# Altium footprint library GyokuRe.PcbLib: 1248 footprints (part 72 of 78)
Each footprint in its own frame and in the unit in brackets; x right, y up, seen from the top. Pads: shape width x height; smd on the part's side, far side on the other; paste and mask are expansions set on the pad; w line width, h text height; cw(c..) or ccw(c..) is an arc to the next point about the centre after c.
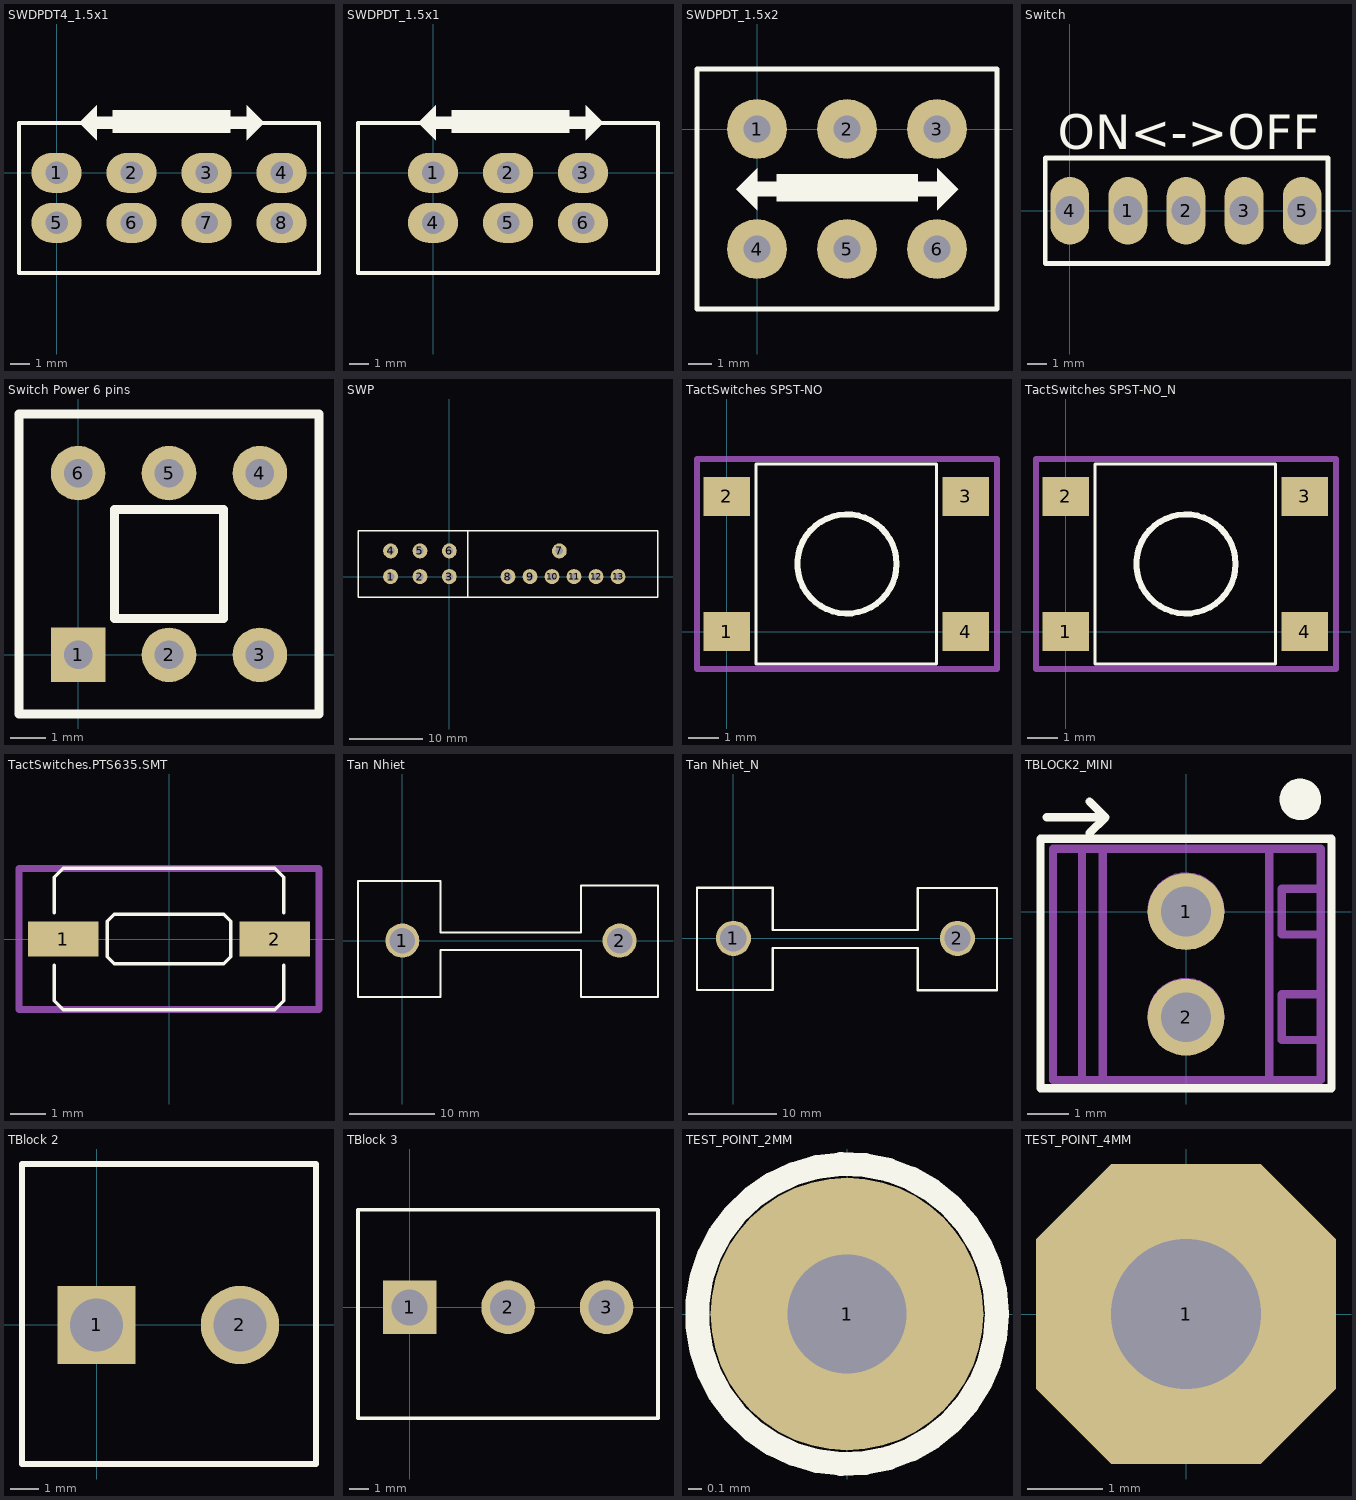
[diagram p71: the footprints below, top view; thin cyan lines are the x and y axes]

## SWDPDT4_1.5x1 [mil] "Switch 3 DPDT, Pin to Pin 150mil, Row to Row 100mil"
pads (8):
  oval 100x80 hole 45: 1(0,0) 2(150,0) 3(300,0) 4(450,0) 5(0,-100) 6(150,-100) 7(300,-100) 8(450,-100)
Top Overlay:
  region: 80,135 80,65 45,100
  region: 380,135 380,65 415,100
  region: 112.5,125 347.5,125 347.5,80 112.5,80
  lines w8: -75,-200 525,-200 525,100 -75,100 -75,-200
  lines w25: 75,100 125,100 ; 335,100 385,100

## SWDPDT_1.5x1 [mil] "Switch DPDT, Pin to Pin 150mil, Row to Row 100mil"
pads (6):
  oval 100x80 hole 45: 1(0,0) 2(150,0) 3(300,0) 4(0,-100) 5(150,-100) 6(300,-100)
Top Overlay:
  region: 5,135 5,65 -30,100
  region: 305,135 305,65 340,100
  region: 37.5,125 272.5,125 272.5,80 37.5,80
  lines w8: -150,-200 450,-200 450,100 -150,100 -150,-200
  lines w25: 0,100 50,100 ; 260,100 310,100

## SWDPDT_1.5x2 [mil] "Switch DPDT, Pin to Pin 150mil, Row to Row 200mil"
pads (6):
  round 100 hole 45: 1(0,0) 2(150,0) 3(300,0) 4(0,-200) 5(150,-200) 6(300,-200)
Top Overlay:
  region: 0,-65 0,-135 -35,-100
  region: 300,-65 300,-135 335,-100
  region: 32.5,-75 267.5,-75 267.5,-120 32.5,-120
  lines w8: -100,-300 400,-300 400,100 -100,100 -100,-300
  lines w25: -5,-100 45,-100 ; 255,-100 305,-100

## Switch [mm]
pads (5):
  oval 2x3.5 hole 1.5: 1(3,0) 2(6,0) 3(9,0) 4(0,0) 5(12,0)
Top Overlay:
  lines w0.254: -1.27,-2.73 13.335,-2.73 13.335,2.73 -1.27,2.73 -1.27,-2.73
  text "ON<->OFF" at -0.635,3.175 h1.8
3D body "User Library-Assem1-20.STEP": height 2.6, standoff -6, extent -0.5,-2.85 12.5,9.35

## Switch Power 6 pins [mil] "Switch Power 6 pins"
pads (6):
  rect 60x60 hole 31.5: 1(0,0)
  round 60 hole 31.5: 2(100,0) 3(200,0) 4(200,200) 5(100,200) 6(0,200)
Top Overlay:
  lines w10: -65,-65 265,-65 265,265 -65,265 -65,-65 ; 40,40 40,160 160,160 160,40 40,40
3D body: height 196.85, standoff 118.11, extent -56.39,-57.09 256.89,255.62
3D body: height 275.59, standoff 236.22, extent 60.04,59.06 140.75,139.76
3D body: height 236.22, standoff 196.85, extent 40.35,40.35 159.45,160.43
3D body: height 118.11, standoff 3.94, extent -60.04,-60.04 259.84,260.83

## SWP [mil] "SW Power"
height 100
pads (13):
  round 80 hole 40: 1(-314.96,0) 2(-157.48,0) 3(0,0) 4(-314.96,137.8) 5(-157.48,137.8) 6(0,137.8) 7(590.55,137.8) 8(314.96,0) 9(433.07,0) 10(551.18,0) 11(669.29,0) 12(787.4,0) 13(905.51,0)
Top Overlay:
  lines w8: 100,-109.33 100,245 ; -490,-110 1120,-110 1120,245 -490,245 -490,-110

## TactSwitches SPST-NO [mm] "SWITCH TACT 6MM 230GF H=4.3MM"
pads (4):
  rect 1.55x1.3 smd: 1(0,0) 2(0,4.5) 3(7.95,4.5) 4(7.95,0)
Top Overlay:
  circle w0.2: c4,2.25 r1.65
  lines w0.1: 0.975,-1.075 0.975,5.575 6.975,5.575 6.975,-1.075 0.975,-1.075
Mechanical 13:
  lines w0.2: -0.991,-1.245 -0.991,5.74 8.992,5.74 8.992,-1.245 -0.991,-1.245
3D body: height 3.65, standoff 2, extent 0.75,-1.25 7.25,5.75
3D body: height 2, standoff 0.1, extent 1,-1 7,5.5
3D body: height 4.3, standoff 3, extent 2.25,0.5 5.75,4
3D body: height 0.15, standoff 0.01, extent -0.5,4.15 1.1,4.85
3D body: height 0.15, standoff 0.01, extent -0.5,-0.35 1.1,0.35
3D body: height 0.15, standoff 0.01, extent 6.9,4.15 8.5,4.85
3D body: height 0.15, standoff 0.01, extent 6.9,-0.35 8.5,0.35

## TactSwitches SPST-NO_N [mm] "SWITCH TACT 6MM 230GF H=4.3MM"
pads (4):
  rect 1.55x1.3 smd: 1(0,0) 2(0,4.5) 3(7.95,4.5) 4(7.95,0)
Top Overlay:
  circle w0.2: c4,2.25 r1.65
  lines w0.1: 0.975,-1.075 0.975,5.575 6.975,5.575 6.975,-1.075 0.975,-1.075
Mechanical 13:
  lines w0.2: -0.991,-1.245 -0.991,5.74 8.992,5.74 8.992,-1.245 -0.991,-1.245
3D body "TACT Switch - SKHUAME010.STEP": height 2.5, standoff 0, extent 0.432,-0.989 7.632,5.511

## TactSwitches.PTS635.SMT [mil] "3,5 mm Tact Switches, PTS635 Series"
pads (2):
  rect 79x39 smd: 1(-118,0) 2(118,0)
Top Overlay:
  lines w3.94: -127.95,-29.53 -127.95,-68.9 -118.11,-78.74 118.11,-78.74 127.95,-68.9 127.95,-29.53 ; -127.95,29.53 -127.95,68.9 -118.11,78.74 118.11,78.74 127.95,68.9 127.95,29.53 ; -68.9,-19.68 -68.9,19.68 -61.02,27.56 61.02,27.56 68.9,19.68 68.9,-9.84 68.9,-19.68 61.02,-27.56 -61.02,-27.56 -68.9,-19.68
Mechanical 13:
  lines w7.87: -167.32,-78.74 167.32,-78.74 167.32,78.74 -167.32,78.74 -167.32,-78.74
3D body: height 100, standoff 80, extent -65,-22.36 65,22.64
3D body: height 80, standoff 55, extent -95,-50 100,50
3D body: height 55, standoff 0, extent -120,-70 120,70
3D body: height 30, standoff 0, extent -135,-12.5 -120,12.5
3D body: height 30, standoff 0, extent 120,-12.5 135,12.5

## Tan Nhiet [mm]
pads (2):
  round 4 hole 3: 1(0,0) 2(25.5,0)
Top Overlay:
  lines w0.254: -5.2,-6.6 4.475,-6.6 4.475,-1.1 20.975,-1.1 20.975,-6.6 30,-6.6 30,6.45 20.975,6.45 20.975,0.95 4.475,0.95 4.475,6.975 -5.2,6.975 -5.2,-6.6
Bottom Overlay:
  circle w0.254: c25.5,0 r1.652
  circle w0.254: c0,0 r1.652
3D body: height 25, standoff 0.1, extent 1.7,-1.1 23.725,0.975
3D body: height 25, standoff 0.1, extent 20.975,0.95 30,6.6
3D body: height 25, standoff 0.1, extent -4.5,-6.6 4.475,-1.1
3D body: height 25, standoff 0.1, extent -4.5,0.9 4.5,6.45
3D body: height 25, standoff 0.1, extent 20.975,-6.625 29.975,-1.075

## Tan Nhiet_N [mm]
pads (2):
  round 4 hole 3: 1(0,0) 2(25.5,0)
Top Overlay:
  lines w0.254: -4.14,-5.867 4.475,-5.867 4.475,-1.1 20.975,-1.1 20.975,-5.918 30,-5.918 30,5.74 20.975,5.74 20.975,0.95 4.475,0.95 4.475,5.766 -4.14,5.766 -4.14,-5.867
Bottom Overlay:
  circle w0.254: c25.5,0 r1.652
  circle w0.254: c0,0 r1.652
3D body "HeatSink TO220.STEP": height 25, standoff -3.4, extent -4.022,-5.885 29.778,5.715

## TBLOCK2_MINI [mm] "Screw Terminal Strip, 2 Way, 2.54 mm Pitch"
pads (2):
  round 1.85 hole 1.2: 1(0,0) 2(0,-2.54)
Top Overlay:
  circle w0.5: c2.75,2.7 r0.25
  lines w0.2: -3.35,2.27 -1.94,2.27 ; -2.32,1.89 -1.94,2.27 ; -2.32,2.65 -1.94,2.27 ; -3.5,-4.25 3.5,-4.25 3.5,1.75 -3.5,1.75 -3.5,-4.25
Bottom Overlay:
  lines w0.1: -3.48,-4.267 -3.48,1.727 3.48,1.727 3.48,-4.267 -3.48,-4.267
Mechanical 13:
  text ".Designator" at 0.6,-2.925 h2.03
Mechanical 15:
  circle w0.254: c0,0.02 r0.8
  circle w0.254: c0,-2.52 r0.8
  lines w0.2: -2.5,-4.025 -2.5,1.44 ; -2,-4.025 -2,1.5 ; -0.7,-2.1 0.4,-3.2 ; -0.7,0.4 0.3,-0.6 ; -0.2,-1.84 0.7,-2.74 ; -0.2,0.7 0.7,-0.2 ; 2,-4.025 2,1.51 ; 3.2,-3.09 2.3,-3.09 2.3,-1.99 3.2,-1.99 ; 3.2,-0.55 2.3,-0.55 2.3,0.55 3.2,0.55 ; -3.2,1.51 3.24,1.51 3.24,-4.05 -3.198,-4.05 -3.2,1.51
3D body: height 8.5, standoff 4.5, extent -2.7,-4.025 2,1.5
3D body: height 4.5, standoff 0.01, extent -3.2,-4.025 3.25,1.5
3D body: height 2.5, standoff -1, extent -0.55,-3.09 0.55,-1.99
3D body: height 2.5, standoff -1, extent -0.55,-0.55 0.55,0.55
3D body: height 3.5, standoff 1, extent 2.291,-3.284 3.275,-1.774
3D body: height 3.5, standoff 1, extent 2.291,-0.759 3.275,0.751
3D body: height 8.55, standoff 7.6, extent -1.125,-3.565 1.125,-1.515
3D body: height 8.55, standoff 7.6, extent -1.125,-1.025 1.125,1.025
3D body: height 8.6, standoff 7.6, extent 0.129,-3.467 1.029,-1.617
3D body: height 8.6, standoff 7.6, extent -1.021,-3.475 -0.121,-1.625
3D body: height 8.6, standoff 7.6, extent -1.021,-0.925 -0.121,0.925
3D body: height 8.6, standoff 7.6, extent 0.129,-0.917 1.029,0.933

## TBlock 2 [mil] "Connector; Terminal; 2 Positions; Solder Pad 35mil"
pads (2):
  rect 107x107 hole 72: 1(0,0)
  round 107 hole 72: 2(196,0)
Top Overlay:
  lines w7.87: -102,-190 300,-190 300,220 -102,220 -102,-190
3D body "terminal_blocks_a-tb500-ti02.stp": height 560.07, standoff -136.8, extent -121.66,-189 295.67,216.52

## TBlock 3 [mil] "Connector; Terminal; 3 Positions; Solder Pad 35mil"
pads (3):
  rect 107x107 hole 72: 1(0,0)
  round 107 hole 72: 2(197,0) 3(394,0)
Top Overlay:
  lines w7.87: -103,-222 -103,195 497,195 497,-222 -103,-222
3D body "terminal_blocks_a-tb500-ti03.stp": height 120.8, standoff -576.07, extent -98.28,-216 515.9,189.52

## TEST_POINT_2MM [mil] "Test point"
height 150
pads (1):
  round 80 hole 35: 1(0,0)
Top Overlay:
  circle w7: c0,0 r44.01
3D body "socket 1-1.stp": height 178.11, standoff -114.41, extent -50,-50 50,50

## TEST_POINT_4MM [mm] "Test Pad, 1-Pin"
pads (1):
  oct 4x4 hole 2: 1(0,0)